# Altium schematic symbol library jlcpcb_2025_04_resistors_extended_2010.schlib: 1697 symbols (part 9 of 9) (continued)
## WR20X360JTL
designator R?  Resistance: 36Ω  (hidden comment: *)
Resistor, 36Ω, ±5%, 750mW, 200V, ±100ppm/℃, -55℃~+155℃, SMD 2010; Manufacturer: Uniroyal; Manufacturer Part Number: WR20X360JTL; Supplier 1: LCSC; Supplier Part Number 1: C172219; JLCPCB Part Number: C172219; Power Rating: 750mW; Category: Resistors; Package Size: 2010; JLCPCB Basic Part: Yes; Tolerance: ±5%; Voltage Rating: 200V; Temperature Coefficient: ±100ppm/℃; Temperature Rating: -55℃~+155℃; ComponentLink1Description: Datasheet; ComponentLink1URL: https://wmsc.lcsc.com/wmsc/upload/file/pdf/v2/lcsc/2304140030_Walsin-Tech-Corp-WR20X360JTL_C172219.pdf; ComponentLink2Description: JLCPCB Part URL; ComponentLink2URL: https://jlcpcb.com/partdetail/C172219
pins: 1, 2
1 alternate drawing of the same symbol

## WR20X361JTL
designator R?  Resistance: 360Ω  (hidden comment: *)
Resistor, 360Ω, ±5%, 750mW, 200V, ±100ppm/℃, -55℃~+155℃, SMD 2010; Manufacturer: Uniroyal; Manufacturer Part Number: WR20X361JTL; Supplier 1: LCSC; Supplier Part Number 1: C172220; JLCPCB Part Number: C172220; Power Rating: 750mW; Category: Resistors; Package Size: 2010; JLCPCB Basic Part: Yes; Tolerance: ±5%; Voltage Rating: 200V; Temperature Coefficient: ±100ppm/℃; Temperature Rating: -55℃~+155℃; ComponentLink1Description: Datasheet; ComponentLink1URL: https://wmsc.lcsc.com/wmsc/upload/file/pdf/v2/lcsc/2304140030_Walsin-Tech-Corp-WR20X361JTL_C172220.pdf; ComponentLink2Description: JLCPCB Part URL; ComponentLink2URL: https://jlcpcb.com/partdetail/C172220
pins: 1, 2
1 alternate drawing of the same symbol

## WR20X363JTL
designator R?  Resistance: 36kΩ  (hidden comment: *)
Resistor, 36kΩ, ±5%, 750mW, 200V, ±100ppm/℃, -55℃~+155℃, SMD 2010; Manufacturer: Uniroyal; Manufacturer Part Number: WR20X363JTL; Supplier 1: LCSC; Supplier Part Number 1: C172222; JLCPCB Part Number: C172222; Power Rating: 750mW; Category: Resistors; Package Size: 2010; JLCPCB Basic Part: Yes; Tolerance: ±5%; Voltage Rating: 200V; Temperature Coefficient: ±100ppm/℃; Temperature Rating: -55℃~+155℃; ComponentLink1Description: Datasheet; ComponentLink1URL: https://wmsc.lcsc.com/wmsc/upload/file/pdf/v2/lcsc/2304140030_Walsin-Tech-Corp-WR20X363JTL_C172222.pdf; ComponentLink2Description: JLCPCB Part URL; ComponentLink2URL: https://jlcpcb.com/partdetail/C172222
pins: 1, 2
1 alternate drawing of the same symbol

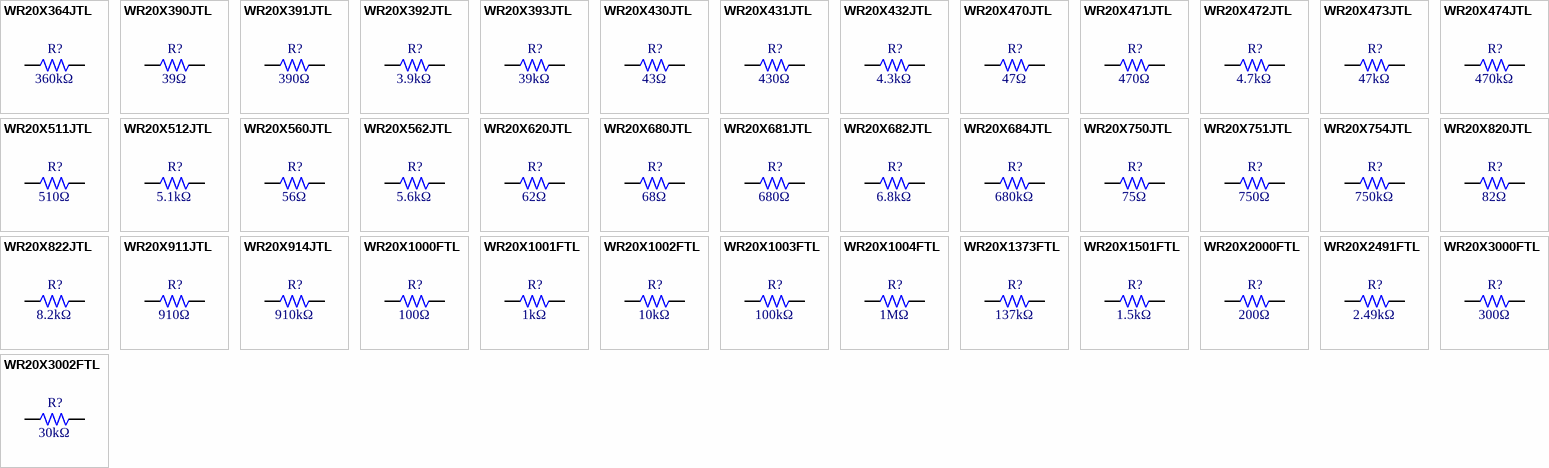
[diagram p41: symbols WR20X364JTL to WR20X3002FTL]

## WR20X364JTL
designator R?  Resistance: 360kΩ  (hidden comment: *)
Resistor, 360kΩ, ±5%, 750mW, 200V, ±100ppm/℃, -55℃~+155℃, SMD 2010; Manufacturer: Uniroyal; Manufacturer Part Number: WR20X364JTL; Supplier 1: LCSC; Supplier Part Number 1: C172223; JLCPCB Part Number: C172223; Power Rating: 750mW; Category: Resistors; Package Size: 2010; JLCPCB Basic Part: Yes; Tolerance: ±5%; Voltage Rating: 200V; Temperature Coefficient: ±100ppm/℃; Temperature Rating: -55℃~+155℃; ComponentLink1Description: Datasheet; ComponentLink1URL: https://wmsc.lcsc.com/wmsc/upload/file/pdf/v2/lcsc/2304140030_Walsin-Tech-Corp-WR20X364JTL_C172223.pdf; ComponentLink2Description: JLCPCB Part URL; ComponentLink2URL: https://jlcpcb.com/partdetail/C172223
pins: 1, 2
1 alternate drawing of the same symbol

## WR20X390JTL
designator R?  Resistance: 39Ω  (hidden comment: *)
Resistor, 39Ω, ±5%, 750mW, 200V, ±100ppm/℃, -55℃~+155℃, SMD 2010; Manufacturer: Uniroyal; Manufacturer Part Number: WR20X390JTL; Supplier 1: LCSC; Supplier Part Number 1: C172224; JLCPCB Part Number: C172224; Power Rating: 750mW; Category: Resistors; Package Size: 2010; JLCPCB Basic Part: Yes; Tolerance: ±5%; Voltage Rating: 200V; Temperature Coefficient: ±100ppm/℃; Temperature Rating: -55℃~+155℃; ComponentLink1Description: Datasheet; ComponentLink1URL: https://wmsc.lcsc.com/wmsc/upload/file/pdf/v2/lcsc/2304140030_Walsin-Tech-Corp-WR20X390JTL_C172224.pdf; ComponentLink2Description: JLCPCB Part URL; ComponentLink2URL: https://jlcpcb.com/partdetail/C172224
pins: 1, 2
1 alternate drawing of the same symbol

## WR20X391JTL
designator R?  Resistance: 390Ω  (hidden comment: *)
Resistor, 390Ω, ±5%, 750mW, 200V, ±100ppm/℃, -55℃~+155℃, SMD 2010; Manufacturer: Uniroyal; Manufacturer Part Number: WR20X391JTL; Supplier 1: LCSC; Supplier Part Number 1: C172225; JLCPCB Part Number: C172225; Power Rating: 750mW; Category: Resistors; Package Size: 2010; JLCPCB Basic Part: Yes; Tolerance: ±5%; Voltage Rating: 200V; Temperature Coefficient: ±100ppm/℃; Temperature Rating: -55℃~+155℃; ComponentLink1Description: Datasheet; ComponentLink1URL: https://wmsc.lcsc.com/wmsc/upload/file/pdf/v2/lcsc/2304140030_Walsin-Tech-Corp-WR20X391JTL_C172225.pdf; ComponentLink2Description: JLCPCB Part URL; ComponentLink2URL: https://jlcpcb.com/partdetail/C172225
pins: 1, 2
1 alternate drawing of the same symbol

## WR20X392JTL
designator R?  Resistance: 3.9kΩ  (hidden comment: *)
Resistor, 3.9kΩ, ±5%, 750mW, 200V, ±100ppm/℃, -55℃~+155℃, SMD 2010; Manufacturer: Uniroyal; Manufacturer Part Number: WR20X392JTL; Supplier 1: LCSC; Supplier Part Number 1: C171278; JLCPCB Part Number: C171278; Power Rating: 750mW; Category: Resistors; Package Size: 2010; JLCPCB Basic Part: Yes; Tolerance: ±5%; Voltage Rating: 200V; Temperature Coefficient: ±100ppm/℃; Temperature Rating: -55℃~+155℃; ComponentLink1Description: Datasheet; ComponentLink1URL: https://wmsc.lcsc.com/wmsc/upload/file/pdf/v2/lcsc/2304140030_Walsin-Tech-Corp-WR20X392JTL_C171278.pdf; ComponentLink2Description: JLCPCB Part URL; ComponentLink2URL: https://jlcpcb.com/partdetail/C171278
pins: 1, 2
1 alternate drawing of the same symbol

## WR20X393JTL
designator R?  Resistance: 39kΩ  (hidden comment: *)
Resistor, 39kΩ, ±5%, 750mW, 200V, ±100ppm/℃, -55℃~+155℃, SMD 2010; Manufacturer: Uniroyal; Manufacturer Part Number: WR20X393JTL; Supplier 1: LCSC; Supplier Part Number 1: C335027; JLCPCB Part Number: C335027; Power Rating: 750mW; Category: Resistors; Package Size: 2010; JLCPCB Basic Part: Yes; Tolerance: ±5%; Voltage Rating: 200V; Temperature Coefficient: ±100ppm/℃; Temperature Rating: -55℃~+155℃; ComponentLink1Description: Datasheet; ComponentLink1URL: https://wmsc.lcsc.com/wmsc/upload/file/pdf/v2/lcsc/2304140030_Walsin-Tech-Corp-WR20X393JTL_C335027.pdf; ComponentLink2Description: JLCPCB Part URL; ComponentLink2URL: https://jlcpcb.com/partdetail/C335027
pins: 1, 2
1 alternate drawing of the same symbol

## WR20X430JTL
designator R?  Resistance: 43Ω  (hidden comment: *)
Resistor, 43Ω, ±5%, 750mW, 200V, ±100ppm/℃, -55℃~+155℃, SMD 2010; Manufacturer: Uniroyal; Manufacturer Part Number: WR20X430JTL; Supplier 1: LCSC; Supplier Part Number 1: C172232; JLCPCB Part Number: C172232; Power Rating: 750mW; Category: Resistors; Package Size: 2010; JLCPCB Basic Part: Yes; Tolerance: ±5%; Voltage Rating: 200V; Temperature Coefficient: ±100ppm/℃; Temperature Rating: -55℃~+155℃; ComponentLink1Description: Datasheet; ComponentLink1URL: https://wmsc.lcsc.com/wmsc/upload/file/pdf/v2/lcsc/2304140030_Walsin-Tech-Corp-WR20X430JTL_C172232.pdf; ComponentLink2Description: JLCPCB Part URL; ComponentLink2URL: https://jlcpcb.com/partdetail/C172232
pins: 1, 2
1 alternate drawing of the same symbol

## WR20X431JTL
designator R?  Resistance: 430Ω  (hidden comment: *)
Resistor, 430Ω, ±5%, 750mW, 200V, ±100ppm/℃, -55℃~+155℃, SMD 2010; Manufacturer: Uniroyal; Manufacturer Part Number: WR20X431JTL; Supplier 1: LCSC; Supplier Part Number 1: C172233; JLCPCB Part Number: C172233; Power Rating: 750mW; Category: Resistors; Package Size: 2010; JLCPCB Basic Part: Yes; Tolerance: ±5%; Voltage Rating: 200V; Temperature Coefficient: ±100ppm/℃; Temperature Rating: -55℃~+155℃; ComponentLink1Description: Datasheet; ComponentLink1URL: https://wmsc.lcsc.com/wmsc/upload/file/pdf/v2/lcsc/2304140030_Walsin-Tech-Corp-WR20X431JTL_C172233.pdf; ComponentLink2Description: JLCPCB Part URL; ComponentLink2URL: https://jlcpcb.com/partdetail/C172233
pins: 1, 2
1 alternate drawing of the same symbol

## WR20X432JTL
designator R?  Resistance: 4.3kΩ  (hidden comment: *)
Resistor, 4.3kΩ, ±5%, 750mW, 200V, ±100ppm/℃, -55℃~+155℃, SMD 2010; Manufacturer: Uniroyal; Manufacturer Part Number: WR20X432JTL; Supplier 1: LCSC; Supplier Part Number 1: C172234; JLCPCB Part Number: C172234; Power Rating: 750mW; Category: Resistors; Package Size: 2010; JLCPCB Basic Part: Yes; Tolerance: ±5%; Voltage Rating: 200V; Temperature Coefficient: ±100ppm/℃; Temperature Rating: -55℃~+155℃; ComponentLink1Description: Datasheet; ComponentLink1URL: https://wmsc.lcsc.com/wmsc/upload/file/pdf/v2/lcsc/2304140030_Walsin-Tech-Corp-WR20X432JTL_C172234.pdf; ComponentLink2Description: JLCPCB Part URL; ComponentLink2URL: https://jlcpcb.com/partdetail/C172234
pins: 1, 2
1 alternate drawing of the same symbol

## WR20X470JTL
designator R?  Resistance: 47Ω  (hidden comment: *)
Resistor, 47Ω, ±5%, 750mW, 200V, ±100ppm/℃, -55℃~+155℃, SMD 2010; Manufacturer: Uniroyal; Manufacturer Part Number: WR20X470JTL; Supplier 1: LCSC; Supplier Part Number 1: C171279; JLCPCB Part Number: C171279; Power Rating: 750mW; Category: Resistors; Package Size: 2010; JLCPCB Basic Part: Yes; Tolerance: ±5%; Voltage Rating: 200V; Temperature Coefficient: ±100ppm/℃; Temperature Rating: -55℃~+155℃; ComponentLink1Description: Datasheet; ComponentLink1URL: https://wmsc.lcsc.com/wmsc/upload/file/pdf/v2/lcsc/2304140030_Walsin-Tech-Corp-WR20X470JTL_C171279.pdf; ComponentLink2Description: JLCPCB Part URL; ComponentLink2URL: https://jlcpcb.com/partdetail/C171279
pins: 1, 2
1 alternate drawing of the same symbol

## WR20X471JTL
designator R?  Resistance: 470Ω  (hidden comment: *)
Resistor, 470Ω, ±5%, 750mW, ±100ppm/℃, SMD 2010; Manufacturer: Uniroyal; Manufacturer Part Number: WR20X471JTL; Supplier 1: LCSC; Supplier Part Number 1: C171280; JLCPCB Part Number: C171280; Power Rating: 750mW; Category: Resistors; Package Size: 2010; JLCPCB Basic Part: Yes; Tolerance: ±5%; Temperature Coefficient: ±100ppm/℃; ComponentLink1Description: Datasheet; ComponentLink1URL: https://wmsc.lcsc.com/wmsc/upload/file/pdf/v2/lcsc/2304140030_Walsin-Tech-Corp-WR20X471JTL_C171280.pdf; ComponentLink2Description: JLCPCB Part URL; ComponentLink2URL: https://jlcpcb.com/partdetail/C171280
pins: 1, 2
1 alternate drawing of the same symbol

## WR20X472JTL
designator R?  Resistance: 4.7kΩ  (hidden comment: *)
Resistor, 4.7kΩ, ±5%, 750mW, 200V, ±100ppm/℃, -55℃~+155℃, SMD 2010; Manufacturer: Uniroyal; Manufacturer Part Number: WR20X472JTL; Supplier 1: LCSC; Supplier Part Number 1: C171281; JLCPCB Part Number: C171281; Power Rating: 750mW; Category: Resistors; Package Size: 2010; JLCPCB Basic Part: Yes; Tolerance: ±5%; Voltage Rating: 200V; Temperature Coefficient: ±100ppm/℃; Temperature Rating: -55℃~+155℃; ComponentLink1Description: Datasheet; ComponentLink1URL: https://wmsc.lcsc.com/wmsc/upload/file/pdf/v2/lcsc/2304140030_Walsin-Tech-Corp-WR20X472JTL_C171281.pdf; ComponentLink2Description: JLCPCB Part URL; ComponentLink2URL: https://jlcpcb.com/partdetail/C171281
pins: 1, 2
1 alternate drawing of the same symbol

## WR20X473JTL
designator R?  Resistance: 47kΩ  (hidden comment: *)
Resistor, 47kΩ, ±5%, 750mW, 200V, ±100ppm/℃, -55℃~+155℃, SMD 2010; Manufacturer: Uniroyal; Manufacturer Part Number: WR20X473JTL; Supplier 1: LCSC; Supplier Part Number 1: C171282; JLCPCB Part Number: C171282; Power Rating: 750mW; Category: Resistors; Package Size: 2010; JLCPCB Basic Part: Yes; Tolerance: ±5%; Voltage Rating: 200V; Temperature Coefficient: ±100ppm/℃; Temperature Rating: -55℃~+155℃; ComponentLink1Description: Datasheet; ComponentLink1URL: https://wmsc.lcsc.com/wmsc/upload/file/pdf/v2/lcsc/2304140030_Walsin-Tech-Corp-WR20X473JTL_C171282.pdf; ComponentLink2Description: JLCPCB Part URL; ComponentLink2URL: https://jlcpcb.com/partdetail/C171282
pins: 1, 2
1 alternate drawing of the same symbol

## WR20X474JTL
designator R?  Resistance: 470kΩ  (hidden comment: *)
Resistor, 470kΩ, ±5%, 750mW, 200V, ±100ppm/℃, -55℃~+155℃, SMD 2010; Manufacturer: Uniroyal; Manufacturer Part Number: WR20X474JTL; Supplier 1: LCSC; Supplier Part Number 1: C172237; JLCPCB Part Number: C172237; Power Rating: 750mW; Category: Resistors; Package Size: 2010; JLCPCB Basic Part: Yes; Tolerance: ±5%; Voltage Rating: 200V; Temperature Coefficient: ±100ppm/℃; Temperature Rating: -55℃~+155℃; ComponentLink1Description: Datasheet; ComponentLink1URL: https://wmsc.lcsc.com/wmsc/upload/file/pdf/v2/lcsc/2304140030_Walsin-Tech-Corp-WR20X474JTL_C172237.pdf; ComponentLink2Description: JLCPCB Part URL; ComponentLink2URL: https://jlcpcb.com/partdetail/C172237
pins: 1, 2
1 alternate drawing of the same symbol

## WR20X511JTL
designator R?  Resistance: 510Ω  (hidden comment: *)
Resistor, 510Ω, ±5%, 750mW, 200V, ±100ppm/℃, -55℃~+155℃, SMD 2010; Manufacturer: Uniroyal; Manufacturer Part Number: WR20X511JTL; Supplier 1: LCSC; Supplier Part Number 1: C171285; JLCPCB Part Number: C171285; Power Rating: 750mW; Category: Resistors; Package Size: 2010; JLCPCB Basic Part: Yes; Tolerance: ±5%; Voltage Rating: 200V; Temperature Coefficient: ±100ppm/℃; Temperature Rating: -55℃~+155℃; ComponentLink1Description: Datasheet; ComponentLink1URL: https://wmsc.lcsc.com/wmsc/upload/file/pdf/v2/lcsc/2304140030_Walsin-Tech-Corp-WR20X511JTL_C171285.pdf; ComponentLink2Description: JLCPCB Part URL; ComponentLink2URL: https://jlcpcb.com/partdetail/C171285
pins: 1, 2
1 alternate drawing of the same symbol

## WR20X512JTL
designator R?  Resistance: 5.1kΩ  (hidden comment: *)
Resistor, 5.1kΩ, ±5%, 750mW, 200V, ±100ppm/℃, -55℃~+155℃, SMD 2010; Manufacturer: Uniroyal; Manufacturer Part Number: WR20X512JTL; Supplier 1: LCSC; Supplier Part Number 1: C172240; JLCPCB Part Number: C172240; Power Rating: 750mW; Category: Resistors; Package Size: 2010; JLCPCB Basic Part: Yes; Tolerance: ±5%; Voltage Rating: 200V; Temperature Coefficient: ±100ppm/℃; Temperature Rating: -55℃~+155℃; ComponentLink1Description: Datasheet; ComponentLink1URL: https://wmsc.lcsc.com/wmsc/upload/file/pdf/v2/lcsc/2304140030_Walsin-Tech-Corp-WR20X512JTL_C172240.pdf; ComponentLink2Description: JLCPCB Part URL; ComponentLink2URL: https://jlcpcb.com/partdetail/C172240
pins: 1, 2
1 alternate drawing of the same symbol

## WR20X560JTL
designator R?  Resistance: 56Ω  (hidden comment: *)
Resistor, 56Ω, ±5%, 750mW, 200V, ±100ppm/℃, -55℃~+155℃, SMD 2010; Manufacturer: Uniroyal; Manufacturer Part Number: WR20X560JTL; Supplier 1: LCSC; Supplier Part Number 1: C172242; JLCPCB Part Number: C172242; Power Rating: 750mW; Category: Resistors; Package Size: 2010; JLCPCB Basic Part: Yes; Tolerance: ±5%; Voltage Rating: 200V; Temperature Coefficient: ±100ppm/℃; Temperature Rating: -55℃~+155℃; ComponentLink1Description: Datasheet; ComponentLink1URL: https://wmsc.lcsc.com/wmsc/upload/file/pdf/v2/lcsc/2304140030_Walsin-Tech-Corp-WR20X560JTL_C172242.pdf; ComponentLink2Description: JLCPCB Part URL; ComponentLink2URL: https://jlcpcb.com/partdetail/C172242
pins: 1, 2
1 alternate drawing of the same symbol

## WR20X562JTL
designator R?  Resistance: 5.6kΩ  (hidden comment: *)
Resistor, 5.6kΩ, ±5%, 750mW, 200V, ±100ppm/℃, -55℃~+155℃, SMD 2010; Manufacturer: Uniroyal; Manufacturer Part Number: WR20X562JTL; Supplier 1: LCSC; Supplier Part Number 1: C172244; JLCPCB Part Number: C172244; Power Rating: 750mW; Category: Resistors; Package Size: 2010; JLCPCB Basic Part: Yes; Tolerance: ±5%; Voltage Rating: 200V; Temperature Coefficient: ±100ppm/℃; Temperature Rating: -55℃~+155℃; ComponentLink1Description: Datasheet; ComponentLink1URL: https://wmsc.lcsc.com/wmsc/upload/file/pdf/v2/lcsc/2304140030_Walsin-Tech-Corp-WR20X562JTL_C172244.pdf; ComponentLink2Description: JLCPCB Part URL; ComponentLink2URL: https://jlcpcb.com/partdetail/C172244
pins: 1, 2
1 alternate drawing of the same symbol

## WR20X620JTL
designator R?  Resistance: 62Ω  (hidden comment: *)
Resistor, 62Ω, ±5%, 750mW, 200V, ±100ppm/℃, -55℃~+155℃, SMD 2010; Manufacturer: Uniroyal; Manufacturer Part Number: WR20X620JTL; Supplier 1: LCSC; Supplier Part Number 1: C172248; JLCPCB Part Number: C172248; Power Rating: 750mW; Category: Resistors; Package Size: 2010; JLCPCB Basic Part: Yes; Tolerance: ±5%; Voltage Rating: 200V; Temperature Coefficient: ±100ppm/℃; Temperature Rating: -55℃~+155℃; ComponentLink1Description: Datasheet; ComponentLink1URL: https://wmsc.lcsc.com/wmsc/upload/file/pdf/v2/lcsc/2304140030_Walsin-Tech-Corp-WR20X620JTL_C172248.pdf; ComponentLink2Description: JLCPCB Part URL; ComponentLink2URL: https://jlcpcb.com/partdetail/C172248
pins: 1, 2
1 alternate drawing of the same symbol

## WR20X680JTL
designator R?  Resistance: 68Ω  (hidden comment: *)
Resistor, 68Ω, ±5%, 750mW, 200V, ±100ppm/℃, -55℃~+155℃, SMD 2010; Manufacturer: Uniroyal; Manufacturer Part Number: WR20X680JTL; Supplier 1: LCSC; Supplier Part Number 1: C172253; JLCPCB Part Number: C172253; Power Rating: 750mW; Category: Resistors; Package Size: 2010; JLCPCB Basic Part: Yes; Tolerance: ±5%; Voltage Rating: 200V; Temperature Coefficient: ±100ppm/℃; Temperature Rating: -55℃~+155℃; ComponentLink1Description: Datasheet; ComponentLink1URL: https://wmsc.lcsc.com/wmsc/upload/file/pdf/v2/lcsc/2304140030_Walsin-Tech-Corp-WR20X680JTL_C172253.pdf; ComponentLink2Description: JLCPCB Part URL; ComponentLink2URL: https://jlcpcb.com/partdetail/C172253
pins: 1, 2
1 alternate drawing of the same symbol

## WR20X681JTL
designator R?  Resistance: 680Ω  (hidden comment: *)
Resistor, 680Ω, ±5%, 750mW, 200V, ±100ppm/℃, -55℃~+155℃, SMD 2010; Manufacturer: Uniroyal; Manufacturer Part Number: WR20X681JTL; Supplier 1: LCSC; Supplier Part Number 1: C172254; JLCPCB Part Number: C172254; Power Rating: 750mW; Category: Resistors; Package Size: 2010; JLCPCB Basic Part: Yes; Tolerance: ±5%; Voltage Rating: 200V; Temperature Coefficient: ±100ppm/℃; Temperature Rating: -55℃~+155℃; ComponentLink1Description: Datasheet; ComponentLink1URL: https://wmsc.lcsc.com/wmsc/upload/file/pdf/v2/lcsc/2304140030_Walsin-Tech-Corp-WR20X681JTL_C172254.pdf; ComponentLink2Description: JLCPCB Part URL; ComponentLink2URL: https://jlcpcb.com/partdetail/C172254
pins: 1, 2
1 alternate drawing of the same symbol

## WR20X682JTL
designator R?  Resistance: 6.8kΩ  (hidden comment: *)
Resistor, 6.8kΩ, ±5%, 750mW, 200V, ±100ppm/℃, -55℃~+155℃, SMD 2010; Manufacturer: Uniroyal; Manufacturer Part Number: WR20X682JTL; Supplier 1: LCSC; Supplier Part Number 1: C171286; JLCPCB Part Number: C171286; Power Rating: 750mW; Category: Resistors; Package Size: 2010; JLCPCB Basic Part: Yes; Tolerance: ±5%; Voltage Rating: 200V; Temperature Coefficient: ±100ppm/℃; Temperature Rating: -55℃~+155℃; ComponentLink1Description: Datasheet; ComponentLink1URL: https://wmsc.lcsc.com/wmsc/upload/file/pdf/v2/lcsc/2304140030_Walsin-Tech-Corp-WR20X682JTL_C171286.pdf; ComponentLink2Description: JLCPCB Part URL; ComponentLink2URL: https://jlcpcb.com/partdetail/C171286
pins: 1, 2
1 alternate drawing of the same symbol

## WR20X684JTL
designator R?  Resistance: 680kΩ  (hidden comment: *)
Resistor, 680kΩ, ±5%, 750mW, 200V, ±100ppm/℃, -55℃~+155℃, SMD 2010; Manufacturer: Uniroyal; Manufacturer Part Number: WR20X684JTL; Supplier 1: LCSC; Supplier Part Number 1: C172255; JLCPCB Part Number: C172255; Power Rating: 750mW; Category: Resistors; Package Size: 2010; JLCPCB Basic Part: Yes; Tolerance: ±5%; Voltage Rating: 200V; Temperature Coefficient: ±100ppm/℃; Temperature Rating: -55℃~+155℃; ComponentLink1Description: Datasheet; ComponentLink1URL: https://wmsc.lcsc.com/wmsc/upload/file/pdf/v2/lcsc/2304140030_Walsin-Tech-Corp-WR20X684JTL_C172255.pdf; ComponentLink2Description: JLCPCB Part URL; ComponentLink2URL: https://jlcpcb.com/partdetail/C172255
pins: 1, 2
1 alternate drawing of the same symbol

## WR20X750JTL
designator R?  Resistance: 75Ω  (hidden comment: *)
Resistor, 75Ω, ±5%, 750mW, 200V, ±100ppm/℃, -55℃~+155℃, SMD 2010; Manufacturer: Uniroyal; Manufacturer Part Number: WR20X750JTL; Supplier 1: LCSC; Supplier Part Number 1: C172257; JLCPCB Part Number: C172257; Power Rating: 750mW; Category: Resistors; Package Size: 2010; JLCPCB Basic Part: Yes; Tolerance: ±5%; Voltage Rating: 200V; Temperature Coefficient: ±100ppm/℃; Temperature Rating: -55℃~+155℃; ComponentLink1Description: Datasheet; ComponentLink1URL: https://wmsc.lcsc.com/wmsc/upload/file/pdf/v2/lcsc/2304140030_Walsin-Tech-Corp-WR20X750JTL_C172257.pdf; ComponentLink2Description: JLCPCB Part URL; ComponentLink2URL: https://jlcpcb.com/partdetail/C172257
pins: 1, 2
1 alternate drawing of the same symbol

## WR20X751JTL
designator R?  Resistance: 750Ω  (hidden comment: *)
Resistor, 750Ω, ±5%, 750mW, 200V, ±100ppm/℃, -55℃~+155℃, SMD 2010; Manufacturer: Uniroyal; Manufacturer Part Number: WR20X751JTL; Supplier 1: LCSC; Supplier Part Number 1: C172258; JLCPCB Part Number: C172258; Power Rating: 750mW; Category: Resistors; Package Size: 2010; JLCPCB Basic Part: Yes; Tolerance: ±5%; Voltage Rating: 200V; Temperature Coefficient: ±100ppm/℃; Temperature Rating: -55℃~+155℃; ComponentLink1Description: Datasheet; ComponentLink1URL: https://wmsc.lcsc.com/wmsc/upload/file/pdf/v2/lcsc/2304140030_Walsin-Tech-Corp-WR20X751JTL_C172258.pdf; ComponentLink2Description: JLCPCB Part URL; ComponentLink2URL: https://jlcpcb.com/partdetail/C172258
pins: 1, 2
1 alternate drawing of the same symbol

## WR20X754JTL
designator R?  Resistance: 750kΩ  (hidden comment: *)
Resistor, 750kΩ, ±5%, 750mW, ±100ppm/℃, SMD 2010; Manufacturer: Uniroyal; Manufacturer Part Number: WR20X754JTL; Supplier 1: LCSC; Supplier Part Number 1: C172261; JLCPCB Part Number: C172261; Power Rating: 750mW; Category: Resistors; Package Size: 2010; JLCPCB Basic Part: Yes; Tolerance: ±5%; Temperature Coefficient: ±100ppm/℃; ComponentLink1Description: Datasheet; ComponentLink1URL: https://wmsc.lcsc.com/wmsc/upload/file/pdf/v2/lcsc/2304140030_Walsin-Tech-Corp-WR20X754JTL_C172261.pdf; ComponentLink2Description: JLCPCB Part URL; ComponentLink2URL: https://jlcpcb.com/partdetail/C172261
pins: 1, 2
1 alternate drawing of the same symbol

## WR20X820JTL
designator R?  Resistance: 82Ω  (hidden comment: *)
Resistor, 82Ω, ±5%, 750mW, 200V, ±100ppm/℃, -55℃~+155℃, SMD 2010; Manufacturer: Uniroyal; Manufacturer Part Number: WR20X820JTL; Supplier 1: LCSC; Supplier Part Number 1: C172263; JLCPCB Part Number: C172263; Power Rating: 750mW; Category: Resistors; Package Size: 2010; JLCPCB Basic Part: Yes; Tolerance: ±5%; Voltage Rating: 200V; Temperature Coefficient: ±100ppm/℃; Temperature Rating: -55℃~+155℃; ComponentLink1Description: Datasheet; ComponentLink1URL: https://wmsc.lcsc.com/wmsc/upload/file/pdf/v2/lcsc/2304140030_Walsin-Tech-Corp-WR20X820JTL_C172263.pdf; ComponentLink2Description: JLCPCB Part URL; ComponentLink2URL: https://jlcpcb.com/partdetail/C172263
pins: 1, 2
1 alternate drawing of the same symbol

## WR20X822JTL
designator R?  Resistance: 8.2kΩ  (hidden comment: *)
Resistor, 8.2kΩ, ±5%, 750mW, 200V, ±100ppm/℃, -55℃~+155℃, SMD 2010; Manufacturer: Uniroyal; Manufacturer Part Number: WR20X822JTL; Supplier 1: LCSC; Supplier Part Number 1: C172265; JLCPCB Part Number: C172265; Power Rating: 750mW; Category: Resistors; Package Size: 2010; JLCPCB Basic Part: Yes; Tolerance: ±5%; Voltage Rating: 200V; Temperature Coefficient: ±100ppm/℃; Temperature Rating: -55℃~+155℃; ComponentLink1Description: Datasheet; ComponentLink1URL: https://wmsc.lcsc.com/wmsc/upload/file/pdf/v2/lcsc/2304140030_Walsin-Tech-Corp-WR20X822JTL_C172265.pdf; ComponentLink2Description: JLCPCB Part URL; ComponentLink2URL: https://jlcpcb.com/partdetail/C172265
pins: 1, 2
1 alternate drawing of the same symbol

## WR20X911JTL
designator R?  Resistance: 910Ω  (hidden comment: *)
Resistor, 910Ω, ±5%, 750mW, 200V, ±100ppm/℃, -55℃~+155℃, SMD 2010; Manufacturer: Uniroyal; Manufacturer Part Number: WR20X911JTL; Supplier 1: LCSC; Supplier Part Number 1: C172270; JLCPCB Part Number: C172270; Power Rating: 750mW; Category: Resistors; Package Size: 2010; JLCPCB Basic Part: Yes; Tolerance: ±5%; Voltage Rating: 200V; Temperature Coefficient: ±100ppm/℃; Temperature Rating: -55℃~+155℃; ComponentLink1Description: Datasheet; ComponentLink1URL: https://wmsc.lcsc.com/wmsc/upload/file/pdf/v2/lcsc/2304140030_Walsin-Tech-Corp-WR20X911JTL_C172270.pdf; ComponentLink2Description: JLCPCB Part URL; ComponentLink2URL: https://jlcpcb.com/partdetail/C172270
pins: 1, 2
1 alternate drawing of the same symbol

## WR20X914JTL
designator R?  Resistance: 910kΩ  (hidden comment: *)
Resistor, 910kΩ, ±5%, 750mW, 200V, ±100ppm/℃, -55℃~+155℃, SMD 2010; Manufacturer: Uniroyal; Manufacturer Part Number: WR20X914JTL; Supplier 1: LCSC; Supplier Part Number 1: C172273; JLCPCB Part Number: C172273; Power Rating: 750mW; Category: Resistors; Package Size: 2010; JLCPCB Basic Part: Yes; Tolerance: ±5%; Voltage Rating: 200V; Temperature Coefficient: ±100ppm/℃; Temperature Rating: -55℃~+155℃; ComponentLink1Description: Datasheet; ComponentLink1URL: https://wmsc.lcsc.com/wmsc/upload/file/pdf/v2/lcsc/2304140030_Walsin-Tech-Corp-WR20X914JTL_C172273.pdf; ComponentLink2Description: JLCPCB Part URL; ComponentLink2URL: https://jlcpcb.com/partdetail/C172273
pins: 1, 2
1 alternate drawing of the same symbol

## WR20X1000FTL
designator R?  Resistance: 100Ω  (hidden comment: *)
Resistor, 100Ω, ±1%, 750mW, 200V, ±100ppm/℃, -55℃~+155℃, SMD 2010; Manufacturer: Uniroyal; Manufacturer Part Number: WR20X1000FTL; Supplier 1: LCSC; Supplier Part Number 1: C335020; JLCPCB Part Number: C335020; Power Rating: 750mW; Category: Resistors; Package Size: 2010; JLCPCB Basic Part: Yes; Tolerance: ±1%; Voltage Rating: 200V; Temperature Coefficient: ±100ppm/℃; Temperature Rating: -55℃~+155℃; ComponentLink1Description: Datasheet; ComponentLink1URL: https://wmsc.lcsc.com/wmsc/upload/file/pdf/v2/lcsc/2304140030_Walsin-Tech-Corp-WR20X1000FTL_C335020.pdf; ComponentLink2Description: JLCPCB Part URL; ComponentLink2URL: https://jlcpcb.com/partdetail/C335020
pins: 1, 2
1 alternate drawing of the same symbol

## WR20X1001FTL
designator R?  Resistance: 1kΩ  (hidden comment: *)
Resistor, 1kΩ, ±1%, 750mW, 200V, ±100ppm/℃, -55℃~+155℃, SMD 2010; Manufacturer: Uniroyal; Manufacturer Part Number: WR20X1001FTL; Supplier 1: LCSC; Supplier Part Number 1: C335021; JLCPCB Part Number: C335021; Power Rating: 750mW; Category: Resistors; Package Size: 2010; JLCPCB Basic Part: Yes; Tolerance: ±1%; Voltage Rating: 200V; Temperature Coefficient: ±100ppm/℃; Temperature Rating: -55℃~+155℃; ComponentLink1Description: Datasheet; ComponentLink1URL: https://wmsc.lcsc.com/wmsc/upload/file/pdf/v2/lcsc/2304140030_Walsin-Tech-Corp-WR20X1001FTL_C335021.pdf; ComponentLink2Description: JLCPCB Part URL; ComponentLink2URL: https://jlcpcb.com/partdetail/C335021
pins: 1, 2
1 alternate drawing of the same symbol

## WR20X1002FTL
designator R?  Resistance: 10kΩ  (hidden comment: *)
Resistor, 10kΩ, ±1%, 750mW, 200V, ±100ppm/℃, -55℃~+155℃, SMD 2010; Manufacturer: Uniroyal; Manufacturer Part Number: WR20X1002FTL; Supplier 1: LCSC; Supplier Part Number 1: C171255; JLCPCB Part Number: C171255; Power Rating: 750mW; Category: Resistors; Package Size: 2010; JLCPCB Basic Part: Yes; Tolerance: ±1%; Voltage Rating: 200V; Temperature Coefficient: ±100ppm/℃; Temperature Rating: -55℃~+155℃; ComponentLink1Description: Datasheet; ComponentLink1URL: https://wmsc.lcsc.com/wmsc/upload/file/pdf/v2/lcsc/2304140030_Walsin-Tech-Corp-WR20X1002FTL_C171255.pdf; ComponentLink2Description: JLCPCB Part URL; ComponentLink2URL: https://jlcpcb.com/partdetail/C171255
pins: 1, 2
1 alternate drawing of the same symbol

## WR20X1003FTL
designator R?  Resistance: 100kΩ  (hidden comment: *)
Resistor, 100kΩ, ±1%, 750mW, -55℃~+155℃, SMD 2010; Manufacturer: Uniroyal; Manufacturer Part Number: WR20X1003FTL; Supplier 1: LCSC; Supplier Part Number 1: C2982960; JLCPCB Part Number: C2982960; Power Rating: 750mW; Category: Resistors; Package Size: 2010; JLCPCB Basic Part: Yes; Tolerance: ±1%; Temperature Rating: -55℃~+155℃; ComponentLink1Description: Datasheet; ComponentLink1URL: https://wmsc.lcsc.com/wmsc/upload/file/pdf/v2/lcsc/2203221830_Walsin-Tech-Corp-WR20X1003FTL_C2982960.pdf; ComponentLink2Description: JLCPCB Part URL; ComponentLink2URL: https://jlcpcb.com/partdetail/C2982960
pins: 1, 2
1 alternate drawing of the same symbol

## WR20X1004FTL
designator R?  Resistance: 1MΩ  (hidden comment: *)
Resistor, 1MΩ, ±1%, 750mW, 200V, ±100ppm/℃, -55℃~+155℃, SMD 2010; Manufacturer: Uniroyal; Manufacturer Part Number: WR20X1004FTL; Supplier 1: LCSC; Supplier Part Number 1: C335022; JLCPCB Part Number: C335022; Power Rating: 750mW; Category: Resistors; Package Size: 2010; JLCPCB Basic Part: Yes; Tolerance: ±1%; Voltage Rating: 200V; Temperature Coefficient: ±100ppm/℃; Temperature Rating: -55℃~+155℃; ComponentLink1Description: Datasheet; ComponentLink1URL: https://wmsc.lcsc.com/wmsc/upload/file/pdf/v2/lcsc/2304140030_Walsin-Tech-Corp-WR20X1004FTL_C335022.pdf; ComponentLink2Description: JLCPCB Part URL; ComponentLink2URL: https://jlcpcb.com/partdetail/C335022
pins: 1, 2
1 alternate drawing of the same symbol

## WR20X1373FTL
designator R?  Resistance: 137kΩ  (hidden comment: *)
Resistor, 137kΩ, ±1%, SMD 2010; Manufacturer: Uniroyal; Manufacturer Part Number: WR20X1373FTL; Supplier 1: LCSC; Supplier Part Number 1: C4555513; JLCPCB Part Number: C4555513; Category: Resistors; Package Size: 2010; JLCPCB Basic Part: Yes; Tolerance: ±1%; ComponentLink1Description: Datasheet; ComponentLink1URL: https://wmsc.lcsc.com/wmsc/upload/file/pdf/v2/lcsc/2207111830_Walsin-Tech-Corp-WR20X1373FTL_C4555513.pdf; ComponentLink2Description: JLCPCB Part URL; ComponentLink2URL: https://jlcpcb.com/partdetail/C4555513
pins: 1, 2
1 alternate drawing of the same symbol

## WR20X1501FTL
designator R?  Resistance: 1.5kΩ  (hidden comment: *)
Resistor, 1.5kΩ, ±1%, 750mW, 200V, ±100ppm/℃, -55℃~+155℃, SMD 2010; Manufacturer: Uniroyal; Manufacturer Part Number: WR20X1501FTL; Supplier 1: LCSC; Supplier Part Number 1: C335023; JLCPCB Part Number: C335023; Power Rating: 750mW; Category: Resistors; Package Size: 2010; JLCPCB Basic Part: Yes; Tolerance: ±1%; Voltage Rating: 200V; Temperature Coefficient: ±100ppm/℃; Temperature Rating: -55℃~+155℃; ComponentLink1Description: Datasheet; ComponentLink1URL: https://wmsc.lcsc.com/wmsc/upload/file/pdf/v2/lcsc/2304140030_Walsin-Tech-Corp-WR20X1501FTL_C335023.pdf; ComponentLink2Description: JLCPCB Part URL; ComponentLink2URL: https://jlcpcb.com/partdetail/C335023
pins: 1, 2
1 alternate drawing of the same symbol

## WR20X2000FTL
designator R?  Resistance: 200Ω  (hidden comment: *)
Resistor, 200Ω, ±1%, 750mW, 200V, ±100ppm/℃, -55℃~+155℃, SMD 2010; Manufacturer: Uniroyal; Manufacturer Part Number: WR20X2000FTL; Supplier 1: LCSC; Supplier Part Number 1: C335024; JLCPCB Part Number: C335024; Power Rating: 750mW; Category: Resistors; Package Size: 2010; JLCPCB Basic Part: Yes; Tolerance: ±1%; Voltage Rating: 200V; Temperature Coefficient: ±100ppm/℃; Temperature Rating: -55℃~+155℃; ComponentLink1Description: Datasheet; ComponentLink1URL: https://wmsc.lcsc.com/wmsc/upload/file/pdf/v2/lcsc/2304140030_Walsin-Tech-Corp-WR20X2000FTL_C335024.pdf; ComponentLink2Description: JLCPCB Part URL; ComponentLink2URL: https://jlcpcb.com/partdetail/C335024
pins: 1, 2
1 alternate drawing of the same symbol

## WR20X2491FTL
designator R?  Resistance: 2.49kΩ  (hidden comment: *)
Resistor, 2.49kΩ, ±1%, 750mW, ±100ppm/℃, -55℃~+155℃, SMD 2010; Manufacturer: Uniroyal; Manufacturer Part Number: WR20X2491FTL; Supplier 1: LCSC; Supplier Part Number 1: C880772; JLCPCB Part Number: C880772; Power Rating: 750mW; Category: Resistors; Package Size: 2010; JLCPCB Basic Part: Yes; Tolerance: ±1%; Temperature Coefficient: ±100ppm/℃; Temperature Rating: -55℃~+155℃; ComponentLink1Description: Datasheet; ComponentLink1URL: https://wmsc.lcsc.com/wmsc/upload/file/pdf/v2/lcsc/2304140030_Walsin-Tech-Corp-WR20X2491FTL_C880772.pdf; ComponentLink2Description: JLCPCB Part URL; ComponentLink2URL: https://jlcpcb.com/partdetail/C880772
pins: 1, 2
1 alternate drawing of the same symbol

## WR20X3000FTL
designator R?  Resistance: 300Ω  (hidden comment: *)
Resistor, 300Ω, ±1%, 750mW, 200V, ±100ppm/℃, -55℃~+155℃, SMD 2010; Manufacturer: Uniroyal; Manufacturer Part Number: WR20X3000FTL; Supplier 1: LCSC; Supplier Part Number 1: C364174; JLCPCB Part Number: C364174; Power Rating: 750mW; Category: Resistors; Package Size: 2010; JLCPCB Basic Part: Yes; Tolerance: ±1%; Voltage Rating: 200V; Temperature Coefficient: ±100ppm/℃; Temperature Rating: -55℃~+155℃; ComponentLink1Description: Datasheet; ComponentLink1URL: https://wmsc.lcsc.com/wmsc/upload/file/pdf/v2/lcsc/2304140030_Walsin-Tech-Corp-WR20X3000FTL_C364174.pdf; ComponentLink2Description: JLCPCB Part URL; ComponentLink2URL: https://jlcpcb.com/partdetail/C364174
pins: 1, 2
1 alternate drawing of the same symbol

## WR20X3002FTL
designator R?  Resistance: 30kΩ  (hidden comment: *)
Resistor, 30kΩ, ±1%, 750mW, 200V, ±100ppm/℃, -55℃~+155℃, SMD 2010; Manufacturer: Uniroyal; Manufacturer Part Number: WR20X3002FTL; Supplier 1: LCSC; Supplier Part Number 1: C335025; JLCPCB Part Number: C335025; Power Rating: 750mW; Category: Resistors; Package Size: 2010; JLCPCB Basic Part: Yes; Tolerance: ±1%; Voltage Rating: 200V; Temperature Coefficient: ±100ppm/℃; Temperature Rating: -55℃~+155℃; ComponentLink1Description: Datasheet; ComponentLink1URL: https://wmsc.lcsc.com/wmsc/upload/file/pdf/v2/lcsc/2304140030_Walsin-Tech-Corp-WR20X3002FTL_C335025.pdf; ComponentLink2Description: JLCPCB Part URL; ComponentLink2URL: https://jlcpcb.com/partdetail/C335025
pins: 1, 2
1 alternate drawing of the same symbol

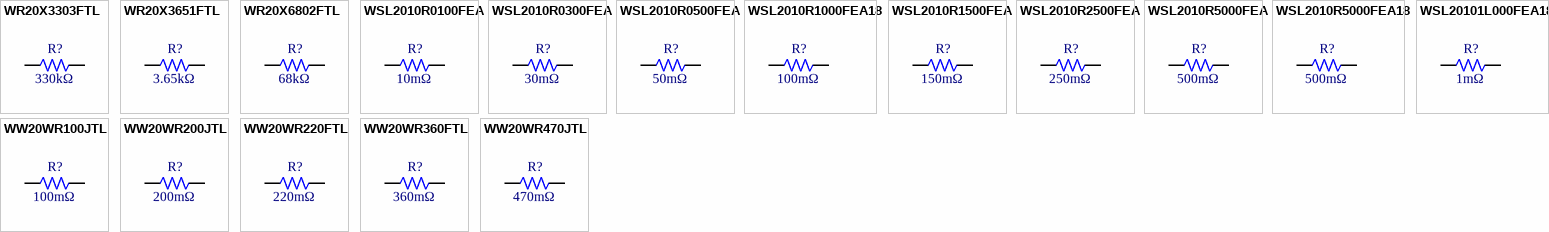
[diagram p42: symbols WR20X3303FTL to WW20WR470JTL]

## WR20X3303FTL
designator R?  Resistance: 330kΩ  (hidden comment: *)
Resistor, 330kΩ, ±1%, 750mW, -55℃~+155℃, SMD 2010; Manufacturer: Uniroyal; Manufacturer Part Number: WR20X3303FTL; Supplier 1: LCSC; Supplier Part Number 1: C2982945; JLCPCB Part Number: C2982945; Power Rating: 750mW; Category: Resistors; Package Size: 2010; JLCPCB Basic Part: Yes; Tolerance: ±1%; Temperature Rating: -55℃~+155℃; ComponentLink1Description: Datasheet; ComponentLink1URL: https://wmsc.lcsc.com/wmsc/upload/file/pdf/v2/lcsc/2203221830_Walsin-Tech-Corp-WR20X3303FTL_C2982945.pdf; ComponentLink2Description: JLCPCB Part URL; ComponentLink2URL: https://jlcpcb.com/partdetail/C2982945
pins: 1, 2
1 alternate drawing of the same symbol

## WR20X3651FTL
designator R?  Resistance: 3.65kΩ  (hidden comment: *)
Resistor, 3.65kΩ, ±1%, 750mW, 200V, ±100ppm/℃, -55℃~+155℃, SMD 2010; Manufacturer: Uniroyal; Manufacturer Part Number: WR20X3651FTL; Supplier 1: LCSC; Supplier Part Number 1: C383923; JLCPCB Part Number: C383923; Power Rating: 750mW; Category: Resistors; Package Size: 2010; JLCPCB Basic Part: Yes; Tolerance: ±1%; Voltage Rating: 200V; Temperature Coefficient: ±100ppm/℃; Temperature Rating: -55℃~+155℃; ComponentLink1Description: Datasheet; ComponentLink1URL: https://wmsc.lcsc.com/wmsc/upload/file/pdf/v2/lcsc/2304140030_Walsin-Tech-Corp-WR20X3651FTL_C383923.pdf; ComponentLink2Description: JLCPCB Part URL; ComponentLink2URL: https://jlcpcb.com/partdetail/C383923
pins: 1, 2
1 alternate drawing of the same symbol

## WR20X6802FTL
designator R?  Resistance: 68kΩ  (hidden comment: *)
Resistor, 68kΩ, ±1%, 750mW, 200V, ±100ppm/℃, -55℃~+155℃, SMD 2010; Manufacturer: Uniroyal; Manufacturer Part Number: WR20X6802FTL; Supplier 1: LCSC; Supplier Part Number 1: C383921; JLCPCB Part Number: C383921; Power Rating: 750mW; Category: Resistors; Package Size: 2010; JLCPCB Basic Part: Yes; Tolerance: ±1%; Voltage Rating: 200V; Temperature Coefficient: ±100ppm/℃; Temperature Rating: -55℃~+155℃; ComponentLink1Description: Datasheet; ComponentLink1URL: https://wmsc.lcsc.com/wmsc/upload/file/pdf/v2/lcsc/2304140030_Walsin-Tech-Corp-WR20X6802FTL_C383921.pdf; ComponentLink2Description: JLCPCB Part URL; ComponentLink2URL: https://jlcpcb.com/partdetail/C383921
pins: 1, 2
1 alternate drawing of the same symbol

## WSL2010R0100FEA
designator R?  Resistance: 10mΩ  (hidden comment: *)
Resistor, 10mΩ, ±1%, 500mW, ±75ppm/℃, -65℃~+170℃, SMD 2010; Manufacturer: Uniroyal; Manufacturer Part Number: WSL2010R0100FEA; Supplier 1: LCSC; Supplier Part Number 1: C844897; JLCPCB Part Number: C844897; Power Rating: 500mW; Category: Resistors; Package Size: 2010; JLCPCB Basic Part: Yes; Tolerance: ±1%; Temperature Coefficient: ±75ppm/℃; Temperature Rating: -65℃~+170℃; ComponentLink1Description: Datasheet; ComponentLink1URL: https://wmsc.lcsc.com/wmsc/upload/file/pdf/v2/lcsc/2011031038_Vishay-Intertech-WSL2010R0100FEA_C844897.pdf; ComponentLink2Description: JLCPCB Part URL; ComponentLink2URL: https://jlcpcb.com/partdetail/C844897
pins: 1, 2
1 alternate drawing of the same symbol

## WSL2010R0300FEA
designator R?  Resistance: 30mΩ  (hidden comment: *)
Resistor, 30mΩ, ±1%, 500mW, ±75ppm/℃, -65℃~+170℃, SMD 2010; Manufacturer: Uniroyal; Manufacturer Part Number: WSL2010R0300FEA; Supplier 1: LCSC; Supplier Part Number 1: C843881; JLCPCB Part Number: C843881; Power Rating: 500mW; Category: Resistors; Package Size: 2010; JLCPCB Basic Part: Yes; Tolerance: ±1%; Temperature Coefficient: ±75ppm/℃; Temperature Rating: -65℃~+170℃; ComponentLink1Description: Datasheet; ComponentLink1URL: https://wmsc.lcsc.com/wmsc/upload/file/pdf/v2/lcsc/2312131902_Vishay-Intertech-WSL2010R0300FEA_C843881.pdf; ComponentLink2Description: JLCPCB Part URL; ComponentLink2URL: https://jlcpcb.com/partdetail/C843881
pins: 1, 2
1 alternate drawing of the same symbol

## WSL2010R0500FEA
designator R?  Resistance: 50mΩ  (hidden comment: *)
Resistor, 50mΩ, ±1%, 500mW, ±75ppm/℃, -65℃~+170℃, SMD 2010; Manufacturer: Uniroyal; Manufacturer Part Number: WSL2010R0500FEA; Supplier 1: LCSC; Supplier Part Number 1: C844689; JLCPCB Part Number: C844689; Power Rating: 500mW; Category: Resistors; Package Size: 2010; JLCPCB Basic Part: Yes; Tolerance: ±1%; Temperature Coefficient: ±75ppm/℃; Temperature Rating: -65℃~+170℃; ComponentLink1Description: Datasheet; ComponentLink1URL: https://wmsc.lcsc.com/wmsc/upload/file/pdf/v2/lcsc/2210190530_Vishay-Intertech-WSL2010R0500FEA_C844689.pdf; ComponentLink2Description: JLCPCB Part URL; ComponentLink2URL: https://jlcpcb.com/partdetail/C844689
pins: 1, 2
1 alternate drawing of the same symbol

## WSL2010R1000FEA18
designator R?  Resistance: 100mΩ  (hidden comment: *)
Resistor, 100mΩ, ±1%, 1W, ±75ppm/℃, -65℃~+170℃, SMD 2010; Manufacturer: Uniroyal; Manufacturer Part Number: WSL2010R1000FEA18; Supplier 1: LCSC; Supplier Part Number 1: C844285; JLCPCB Part Number: C844285; Power Rating: 1W; Category: Resistors; Package Size: 2010; JLCPCB Basic Part: Yes; Tolerance: ±1%; Temperature Coefficient: ±75ppm/℃; Temperature Rating: -65℃~+170℃; ComponentLink1Description: Datasheet; ComponentLink1URL: https://wmsc.lcsc.com/wmsc/upload/file/pdf/v2/lcsc/2210190530_Vishay-Intertech-WSL2010R1000FEA18_C844285.pdf; ComponentLink2Description: JLCPCB Part URL; ComponentLink2URL: https://jlcpcb.com/partdetail/C844285
pins: 1, 2
1 alternate drawing of the same symbol

## WSL2010R1500FEA
designator R?  Resistance: 150mΩ  (hidden comment: *)
Resistor, 150mΩ, ±1%, 500mW, ±75ppm/℃, -65℃~+170℃, SMD 2010; Manufacturer: Uniroyal; Manufacturer Part Number: WSL2010R1500FEA; Supplier 1: LCSC; Supplier Part Number 1: C4033206; JLCPCB Part Number: C4033206; Power Rating: 500mW; Category: Resistors; Package Size: 2010; JLCPCB Basic Part: Yes; Tolerance: ±1%; Temperature Coefficient: ±75ppm/℃; Temperature Rating: -65℃~+170℃; ComponentLink1Description: Datasheet; ComponentLink1URL: https://wmsc.lcsc.com/wmsc/upload/file/pdf/v2/lcsc/2312130930_Vishay-Intertech-WSL2010R1500FEA_C4033206.pdf; ComponentLink2Description: JLCPCB Part URL; ComponentLink2URL: https://jlcpcb.com/partdetail/C4033206
pins: 1, 2
1 alternate drawing of the same symbol

## WSL2010R2500FEA
designator R?  Resistance: 250mΩ  (hidden comment: *)
Resistor, 250mΩ, ±1%, 500mW, ±75ppm/℃, -65℃~+170℃, SMD 2010; Manufacturer: Uniroyal; Manufacturer Part Number: WSL2010R2500FEA; Supplier 1: LCSC; Supplier Part Number 1: C844286; JLCPCB Part Number: C844286; Power Rating: 500mW; Category: Resistors; Package Size: 2010; JLCPCB Basic Part: Yes; Tolerance: ±1%; Temperature Coefficient: ±75ppm/℃; Temperature Rating: -65℃~+170℃; ComponentLink1Description: Datasheet; ComponentLink1URL: https://wmsc.lcsc.com/wmsc/upload/file/pdf/v2/lcsc/2210190530_Vishay-Intertech-WSL2010R2500FEA_C844286.pdf; ComponentLink2Description: JLCPCB Part URL; ComponentLink2URL: https://jlcpcb.com/partdetail/C844286
pins: 1, 2
1 alternate drawing of the same symbol

## WSL2010R5000FEA
designator R?  Resistance: 500mΩ  (hidden comment: *)
Resistor, 500mΩ, ±1%, 500mW, ±75ppm/℃, -65℃~+170℃, SMD 2010; Manufacturer: Uniroyal; Manufacturer Part Number: WSL2010R5000FEA; Supplier 1: LCSC; Supplier Part Number 1: C844287; JLCPCB Part Number: C844287; Power Rating: 500mW; Category: Resistors; Package Size: 2010; JLCPCB Basic Part: Yes; Tolerance: ±1%; Temperature Coefficient: ±75ppm/℃; Temperature Rating: -65℃~+170℃; ComponentLink1Description: Datasheet; ComponentLink1URL: https://wmsc.lcsc.com/wmsc/upload/file/pdf/v2/lcsc/2210190530_Vishay-Intertech-WSL2010R5000FEA_C844287.pdf; ComponentLink2Description: JLCPCB Part URL; ComponentLink2URL: https://jlcpcb.com/partdetail/C844287
pins: 1, 2
1 alternate drawing of the same symbol

## WSL2010R5000FEA18
designator R?  Resistance: 500mΩ  (hidden comment: *)
Resistor, 500mΩ, ±1%, 1W, ±75ppm/℃, -65℃~+170℃, SMD 2010; Manufacturer: Uniroyal; Manufacturer Part Number: WSL2010R5000FEA18; Supplier 1: LCSC; Supplier Part Number 1: C844288; JLCPCB Part Number: C844288; Power Rating: 1W; Category: Resistors; Package Size: 2010; JLCPCB Basic Part: Yes; Tolerance: ±1%; Temperature Coefficient: ±75ppm/℃; Temperature Rating: -65℃~+170℃; ComponentLink1Description: Datasheet; ComponentLink1URL: https://wmsc.lcsc.com/wmsc/upload/file/pdf/v2/lcsc/2206282030_Vishay-Intertech-WSL2010R5000FEA18_C844288.pdf; ComponentLink2Description: JLCPCB Part URL; ComponentLink2URL: https://jlcpcb.com/partdetail/C844288
pins: 1, 2
1 alternate drawing of the same symbol

## WSL20101L000FEA18
designator R?  Resistance: 1mΩ  (hidden comment: *)
Resistor, 1mΩ, ±1%, 1W, ±275ppm/℃, -65℃~+170℃, SMD 2010; Manufacturer: Uniroyal; Manufacturer Part Number: WSL20101L000FEA18; Supplier 1: LCSC; Supplier Part Number 1: C844486; JLCPCB Part Number: C844486; Power Rating: 1W; Category: Resistors; Package Size: 2010; JLCPCB Basic Part: Yes; Tolerance: ±1%; Temperature Coefficient: ±275ppm/℃; Temperature Rating: -65℃~+170℃; ComponentLink1Description: Datasheet; ComponentLink1URL: https://wmsc.lcsc.com/wmsc/upload/file/pdf/v2/lcsc/2210190530_Vishay-Intertech-WSL20101L000FEA18_C844486.pdf; ComponentLink2Description: JLCPCB Part URL; ComponentLink2URL: https://jlcpcb.com/partdetail/C844486
pins: 1, 2
1 alternate drawing of the same symbol

## WW20WR100JTL
designator R?  Resistance: 100mΩ  (hidden comment: *)
Resistor, 100mΩ, ±5%, 750mW, ±100ppm/℃, -55℃~+155℃, SMD 2010; Manufacturer: Uniroyal; Manufacturer Part Number: WW20WR100JTL; Supplier 1: LCSC; Supplier Part Number 1: C171416; JLCPCB Part Number: C171416; Power Rating: 750mW; Category: Resistors; Package Size: 2010; JLCPCB Basic Part: Yes; Tolerance: ±5%; Temperature Coefficient: ±100ppm/℃; Temperature Rating: -55℃~+155℃; ComponentLink1Description: Datasheet; ComponentLink1URL: https://wmsc.lcsc.com/wmsc/upload/file/pdf/v2/lcsc/2304140030_Walsin-Tech-Corp-WW20WR100JTL_C171416.pdf; ComponentLink2Description: JLCPCB Part URL; ComponentLink2URL: https://jlcpcb.com/partdetail/C171416
pins: 1, 2
1 alternate drawing of the same symbol

## WW20WR200JTL
designator R?  Resistance: 200mΩ  (hidden comment: *)
Resistor, 200mΩ, ±5%, 750mW, ±100ppm/℃, -55℃~+155℃, SMD 2010; Manufacturer: Uniroyal; Manufacturer Part Number: WW20WR200JTL; Supplier 1: LCSC; Supplier Part Number 1: C171417; JLCPCB Part Number: C171417; Power Rating: 750mW; Category: Resistors; Package Size: 2010; JLCPCB Basic Part: Yes; Tolerance: ±5%; Temperature Coefficient: ±100ppm/℃; Temperature Rating: -55℃~+155℃; ComponentLink1Description: Datasheet; ComponentLink1URL: https://wmsc.lcsc.com/wmsc/upload/file/pdf/v2/lcsc/2202141730_Walsin-Tech-Corp-WW20WR200JTL_C171417.pdf; ComponentLink2Description: JLCPCB Part URL; ComponentLink2URL: https://jlcpcb.com/partdetail/C171417
pins: 1, 2
1 alternate drawing of the same symbol

## WW20WR220FTL
designator R?  Resistance: 220mΩ  (hidden comment: *)
Resistor, 220mΩ, ±1%, 750mW, ±100ppm/℃, -55℃~+155℃, SMD 2010; Manufacturer: Uniroyal; Manufacturer Part Number: WW20WR220FTL; Supplier 1: LCSC; Supplier Part Number 1: C171415; JLCPCB Part Number: C171415; Power Rating: 750mW; Category: Resistors; Package Size: 2010; JLCPCB Basic Part: Yes; Tolerance: ±1%; Temperature Coefficient: ±100ppm/℃; Temperature Rating: -55℃~+155℃; ComponentLink1Description: Datasheet; ComponentLink1URL: https://wmsc.lcsc.com/wmsc/upload/file/pdf/v2/lcsc/2202141730_Walsin-Tech-Corp-WW20WR220FTL_C171415.pdf; ComponentLink2Description: JLCPCB Part URL; ComponentLink2URL: https://jlcpcb.com/partdetail/C171415
pins: 1, 2
1 alternate drawing of the same symbol

## WW20WR360FTL
designator R?  Resistance: 360mΩ  (hidden comment: *)
Resistor, 360mΩ, ±1%, 750mW, ±100ppm/℃, -55℃~+155℃, SMD 2010; Manufacturer: Uniroyal; Manufacturer Part Number: WW20WR360FTL; Supplier 1: LCSC; Supplier Part Number 1: C172334; JLCPCB Part Number: C172334; Power Rating: 750mW; Category: Resistors; Package Size: 2010; JLCPCB Basic Part: Yes; Tolerance: ±1%; Temperature Coefficient: ±100ppm/℃; Temperature Rating: -55℃~+155℃; ComponentLink1Description: Datasheet; ComponentLink1URL: https://wmsc.lcsc.com/wmsc/upload/file/pdf/v2/lcsc/2202141730_Walsin-Tech-Corp-WW20WR360FTL_C172334.pdf; ComponentLink2Description: JLCPCB Part URL; ComponentLink2URL: https://jlcpcb.com/partdetail/C172334
pins: 1, 2
1 alternate drawing of the same symbol

## WW20WR470JTL
designator R?  Resistance: 470mΩ  (hidden comment: *)
Resistor, 470mΩ, ±5%, 750mW, ±100ppm/℃, -55℃~+155℃, SMD 2010; Manufacturer: Uniroyal; Manufacturer Part Number: WW20WR470JTL; Supplier 1: LCSC; Supplier Part Number 1: C172335; JLCPCB Part Number: C172335; Power Rating: 750mW; Category: Resistors; Package Size: 2010; JLCPCB Basic Part: Yes; Tolerance: ±5%; Temperature Coefficient: ±100ppm/℃; Temperature Rating: -55℃~+155℃; ComponentLink1Description: Datasheet; ComponentLink1URL: https://wmsc.lcsc.com/wmsc/upload/file/pdf/v2/lcsc/2202141730_Walsin-Tech-Corp-WW20WR470JTL_C172335.pdf; ComponentLink2Description: JLCPCB Part URL; ComponentLink2URL: https://jlcpcb.com/partdetail/C172335
pins: 1, 2
1 alternate drawing of the same symbol